# Altium footprint library hand_ad_lib.PcbLib: 105 footprints (part 2 of 7)
Each footprint in its own frame and in the unit in brackets; x right, y up, seen from the top. Pads: shape width x height; smd on the part's side, far side on the other; paste and mask are expansions set on the pad; w line width, h text height; cw(c..) or ccw(c..) is an arc to the next point about the centre after c.
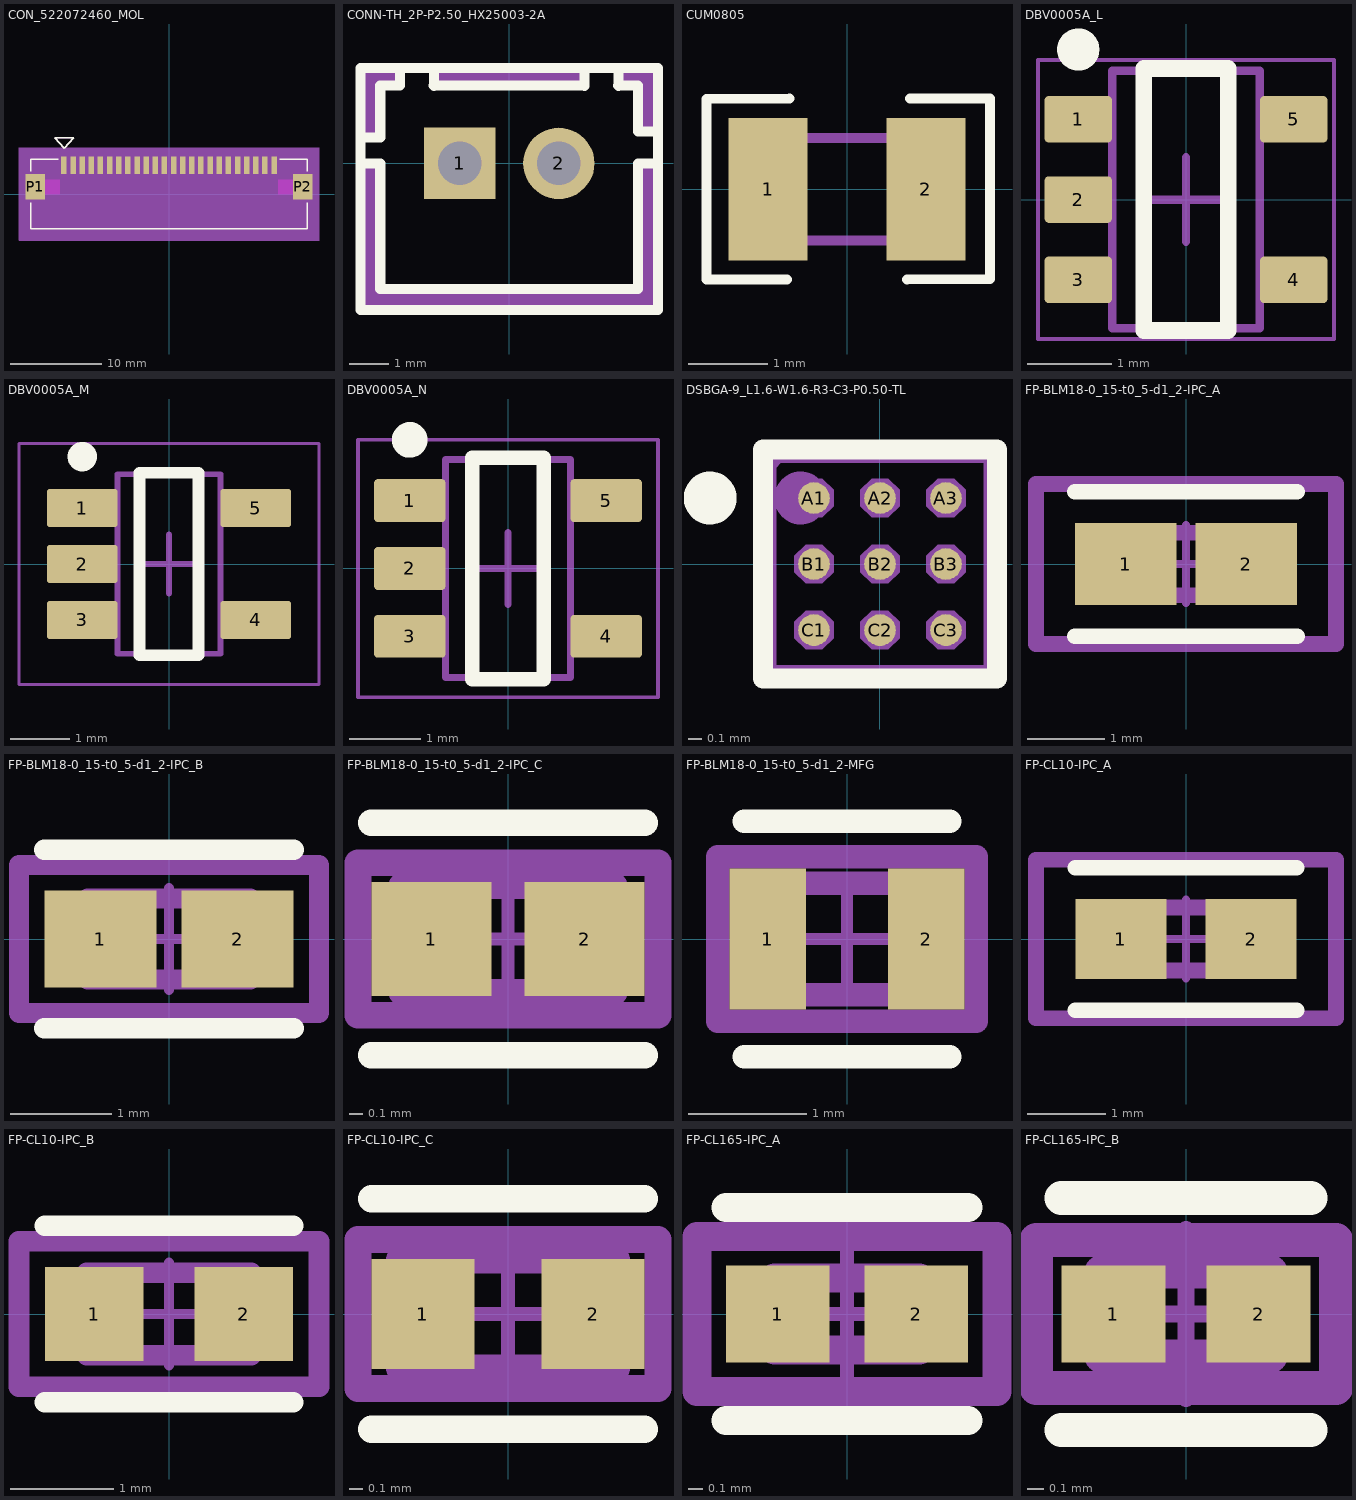
[diagram p1: the footprints below, top view; thin cyan lines are the x and y axes]

## CON_522072460_MOL [mm]
pads (26):
  rect 0.6x1.9 smd paste+0 mask+0.076: 1(-11.5,3.15) 2(-10.5,3.15) 3(-9.5,3.15) 4(-8.5,3.15) 5(-7.5,3.15) 6(-6.5,3.15) 7(-5.5,3.15) 8(-4.5,3.15) 9(-3.5,3.15) 10(-2.5,3.15) 11(-1.5,3.15) 12(-0.5,3.15) 13(0.5,3.15) 14(1.5,3.15) 15(2.5,3.15) 16(3.5,3.15) 17(4.5,3.15) 18(5.5,3.15) 19(6.5,3.15) 20(7.5,3.15) 21(8.5,3.15) 22(9.5,3.15) 23(10.5,3.15) 24(11.5,3.15)
  rect 2.1x2.8 smd paste+0 mask+0.076: P1(-14.65,0.8) P2(14.65,0.8)
Top Overlay:
  lines w0.152: -15.15,-0.918 -15.15,-3.8 15.15,-3.8 15.15,-0.918 ; -15.15,2.517 -15.15,3.8 -12.117,3.8 ; 12.118,3.8 15.15,3.8 15.15,2.517 ; -12.483,6.198 -11.467,5.004 -10.451,6.198 -12.483,6.198
Keep-Out Layer:
  region: 11.95,0 11.95,1.6 13.6,1.6 13.6,0
  region: -11.95,0 -11.95,1.6 -13.6,1.6 -13.6,0
Mechanical 13:
  lines w0.127: -15.15,-3.8 -15.15,3.8 15.15,3.8 15.15,-3.8 -15.15,-3.8 ; -12.483,6.198 -11.467,5.004 -10.451,6.198 -12.483,6.198
Mechanical 15:
  region: 16.42,5.07 -16.42,5.07 -16.42,-5.07 16.42,-5.07
  lines w0.127: -16.42,-5.07 16.42,-5.07 16.42,5.07 -16.42,5.07 -16.42,-5.07
3D body "522072460.stp": height 2.7, standoff 0, extent -15.15,-3.713 15.15,3.887

## CONN-TH_2P-P2.50_HX25003-2A [mm]
pads (2):
  rect 1.8x1.8 hole 1.1 paste+0 mask+0.05: 1(-1.25,0)
  round 1.8 hole 1.1 paste+0 mask+0.05: 2(1.25,0)
Top Overlay:
  lines w0.254: -3.75,-2.416 -3.75,0 -3.25,0 -3.25,-2.416 -3.25,-3.167 3.25,-3.167 3.25,-2.344 3.25,0 3.75,0 3.75,-2.344 ; -3.75,-1.603 -3.75,0.648 -3.25,0.65 -3.25,1.958 -2.75,1.958 -2.75,2.408 ; -1.9,1.95 -1.9,2.4 ; -1.9,1.958 1.9,1.958 ; 1.9,1.95 1.9,2.4 ; 2.75,1.95 2.75,2.399 ; 2.75,1.958 3.25,1.958 3.25,0.8 3.75,0.8 3.75,-1.501 ; -3.75,-3.7 -3.75,2.4 3.75,2.4 3.75,-3.7 -3.75,-3.7
Mechanical 6:
  region: 1.9,2.4 1.9,1.9 -1.9,1.9 -1.9,2.4
  region: 3.25,0 3.75,0 3.75,-3.7 -3.75,-3.7 -3.75,-0.05 -3.25,0 -3.25,-3.167 3.25,-3.167
  region: -2.75,1.9 -3.241,1.9 -3.25,1.908 -3.25,0.75 -3.75,0.75 -3.75,2.35 -2.751,2.35 -2.75,2.349
  region: 2.75,1.95 3.242,1.95 3.25,1.958 3.25,0.8 3.75,0.8 3.75,2.4 2.751,2.4 2.75,2.399
Mechanical 15:
  region: -3.69,-3.5 -3.69,-3.475 -3.725,-3.44 -3.775,-3.44 -3.81,-3.475 -3.81,-3.5 -3.81,-3.525 -3.775,-3.56 -3.725,-3.56 -3.69,-3.525
  region: -1.57,0.32 -0.93,0.32 -0.93,-0.32 -1.57,-0.32
  region: 0.93,0.32 1.57,0.32 1.57,-0.32 0.93,-0.32
  lines w0.051: -3.75,-3.5 3.75,-3.5 3.75,2.4 -3.75,2.4 -3.75,-3.5
3D body "ZX-XH2.54-2PZZ.x_t": height 7.3, standoff -3.3, extent -3.75,-3.5 3.75,2.4

## CUM0805 [mm]
pads (2):
  rect 1x1.8 smd: 1(-1,0) 2(1,0)
Top Overlay:
  lines w0.127: -0.762,-1.143 -1.778,-1.143 -1.778,0.195 -1.778,1.143 -0.728,1.151 ; 0.762,-1.143 1.812,-1.135 1.812,-0.188 1.812,1.151 0.796,1.151
Mechanical 1:
  lines w0.127: -1.025,-0.65 1.025,-0.65 1.025,0.65 -1.025,0.65 -1.025,-0.65
3D body "CUM0805-15FR010.x_t": height 0.41, standoff -0.01, extent -1.125,-0.68 1.125,0.68

## DBV0005A_L [mm] "SOT23, 5-Leads, Body 3.05x1.75mm, Pitch 0.95mm, IPC High Density"
height 1.45
pads (5):
  rrect18% 0.8x0.55 smd: 1(-1.275,0.95) 2(-1.275,0) 3(-1.275,-0.95) 4(1.275,-0.95) 5(1.275,0.95)
Top Overlay:
  circle w0.25: c-1.275,1.775 r0.125
  lines w0.2: -0.5,-1.55 0.5,-1.55 0.5,1.55 -0.5,1.55 -0.5,-1.55
Mechanical 1:
  text ".Designator" at -0.635,-0.254 h0.4
Mechanical 13:
  lines w0.1: -0.875,-1.525 -0.875,1.525 0.875,1.525 0.875,-1.525 -0.875,-1.525
Mechanical 15:
  lines w0.05: -1.75,-1.65 -1.75,1.65 1.75,1.65 1.75,-1.65 -1.75,-1.65
  lines w0.1: -0.5,0 0.5,0 ; 0,-0.5 0,0.5
3D body "DBV0005AaksMF05A.stp": height 1.08, standoff -0.01, extent -1.422,-1.461 1.422,1.46

## DBV0005A_M [mm] "SOT23, 5-Leads, Body 3.05x1.75mm, Pitch 0.95mm, IPC Low Density"
height 1.45
pads (5):
  rrect15% 1.2x0.65 smd: 1(-1.475,0.95) 2(-1.475,0) 3(-1.475,-0.95) 4(1.475,-0.95) 5(1.475,0.95)
Top Overlay:
  circle w0.25: c-1.475,1.825 r0.125
  lines w0.2: -0.5,-1.55 0.5,-1.55 0.5,1.55 -0.5,1.55 -0.5,-1.55
Mechanical 1:
  text ".Designator" at -0.635,-0.127 h0.4
Mechanical 13:
  lines w0.1: -0.875,-1.525 -0.875,1.525 0.875,1.525 0.875,-1.525 -0.875,-1.525
Mechanical 15:
  lines w0.05: -2.55,-2.05 -2.55,2.05 2.55,2.05 2.55,-2.05 -2.55,-2.05
  lines w0.1: -0.5,0 0.5,0 ; 0,-0.5 0,0.5
3D body "DBV0005AaksMF05A.stp": height 1.08, standoff -0.01, extent -1.422,-1.461 1.422,1.46

## DBV0005A_N [mm] "SOT23, 5-Leads, Body 3.05x1.75mm, Pitch 0.95mm, IPC Medium Density"
height 1.45
pads (5):
  rrect17% 1x0.6 smd: 1(-1.375,0.95) 2(-1.375,0) 3(-1.375,-0.95) 4(1.375,-0.95) 5(1.375,0.95)
Top Overlay:
  circle w0.25: c-1.375,1.8 r0.125
  lines w0.2: -0.5,-1.55 -0.5,1.55 0.5,1.55 0.5,-1.55 -0.5,-1.55
Mechanical 1:
  text ".Designator" at -0.635,-0.254 h0.4
Mechanical 13:
  lines w0.1: -0.875,-1.525 0.875,-1.525 0.875,1.525 -0.875,1.525 -0.875,-1.525
Mechanical 15:
  lines w0.05: -2.1,-1.8 2.1,-1.8 2.1,1.8 -2.1,1.8 -2.1,-1.8
  lines w0.1: -0.5,0 0.5,0 ; 0,-0.5 0,0.5
3D body "DBV0005AaksMF05A.stp": height 1.08, standoff -0.01, extent -1.422,-1.461 1.422,1.46

## DSBGA-9_L1.6-W1.6-R3-C3-P0.50-TL [mm]
pads (9):
  round 0.24 smd paste-100 mask+0.038: A1(-0.5,0.5) A2(0,0.5) A3(0.5,0.5) B1(-0.5,0) B2(0,0) B3(0.5,0) C1(-0.5,-0.5) C2(0,-0.5) C3(0.5,-0.5)
Top Overlay:
  circle w0.2: c-1.286,0.5 r0.1
  lines w0.152: -0.886,-0.866 0.886,-0.866 0.886,0.866 -0.886,0.866 -0.886,-0.866
Top Paste:
  region: -0.605,0.65 -0.395,0.65 -0.35,0.605 -0.35,0.395 -0.395,0.35 -0.605,0.35 -0.65,0.395 -0.65,0.605
  region: -0.605,0.15 -0.395,0.15 -0.35,0.105 -0.35,-0.105 -0.395,-0.15 -0.605,-0.15 -0.65,-0.105 -0.65,0.105
  region: -0.605,-0.35 -0.395,-0.35 -0.35,-0.395 -0.35,-0.605 -0.395,-0.65 -0.605,-0.65 -0.65,-0.605 -0.65,-0.395
  region: -0.105,0.65 0.105,0.65 0.15,0.605 0.15,0.395 0.105,0.35 -0.105,0.35 -0.15,0.395 -0.15,0.605
  region: -0.105,0.15 0.105,0.15 0.15,0.105 0.15,-0.105 0.105,-0.15 -0.105,-0.15 -0.15,-0.105 -0.15,0.105
  region: -0.105,-0.35 0.105,-0.35 0.15,-0.395 0.15,-0.605 0.105,-0.65 -0.105,-0.65 -0.15,-0.605 -0.15,-0.395
  region: 0.395,0.65 0.605,0.65 0.65,0.605 0.65,0.395 0.605,0.35 0.395,0.35 0.35,0.395 0.35,0.605
  region: 0.395,0.15 0.605,0.15 0.65,0.105 0.65,-0.105 0.605,-0.15 0.395,-0.15 0.35,-0.105 0.35,0.105
  region: 0.395,-0.35 0.605,-0.35 0.65,-0.395 0.65,-0.605 0.605,-0.65 0.395,-0.65 0.35,-0.605 0.35,-0.395
Mechanical 6:
  circle w0.2: c-0.6,0.5 r0.1
Mechanical 15:
  region: -0.75,0.79 -0.75,0.815 -0.785,0.849 -0.834,0.849 -0.869,0.814 -0.87,0.79 -0.869,0.765 -0.834,0.731 -0.785,0.731 -0.75,0.766
  region: -0.35,0.5 -0.351,0.561 -0.439,0.647 -0.561,0.646 -0.649,0.561 -0.65,0.5 -0.648,0.439 -0.561,0.353 -0.439,0.353 -0.351,0.439
  region: -0.35,0 -0.351,0.061 -0.439,0.147 -0.561,0.147 -0.649,0.061 -0.65,0 -0.648,-0.061 -0.561,-0.146 -0.439,-0.146 -0.351,-0.061
  region: -0.35,-0.5 -0.351,-0.439 -0.439,-0.353 -0.561,-0.354 -0.649,-0.439 -0.65,-0.5 -0.648,-0.561 -0.561,-0.647 -0.439,-0.647 -0.351,-0.561
  region: 0.15,0.5 0.149,0.561 0.061,0.647 -0.061,0.646 -0.148,0.561 -0.15,0.5 -0.148,0.439 -0.061,0.353 0.061,0.353 0.149,0.439
  region: 0.15,0 0.149,0.061 0.061,0.147 -0.061,0.147 -0.148,0.061 -0.15,0 -0.148,-0.061 -0.061,-0.146 0.061,-0.146 0.149,-0.061
  region: 0.15,-0.5 0.149,-0.439 0.061,-0.353 -0.061,-0.354 -0.148,-0.439 -0.15,-0.5 -0.148,-0.561 -0.061,-0.647 0.061,-0.647 0.149,-0.561
  region: 0.65,0.5 0.649,0.561 0.561,0.647 0.439,0.646 0.351,0.561 0.35,0.5 0.352,0.439 0.439,0.353 0.561,0.353 0.649,0.439
  region: 0.65,0 0.649,0.061 0.561,0.147 0.439,0.147 0.351,0.061 0.35,0 0.352,-0.061 0.439,-0.146 0.561,-0.146 0.649,-0.061
  region: 0.65,-0.5 0.649,-0.439 0.561,-0.353 0.439,-0.354 0.351,-0.439 0.35,-0.5 0.352,-0.561 0.439,-0.647 0.561,-0.647 0.649,-0.561
  lines w0.051: -0.81,-0.79 0.81,-0.79 0.81,0.79 -0.81,0.79 -0.81,-0.79
3D body "BQ27427YZER_Mod.x_t": height 0.64, standoff 0, extent -0.79,-0.81 0.79,0.81

## FP-BLM18-0_15-t0_5-d1_2-IPC_A [mm]
pads (2):
  rect 1.306x1.058 smd paste+0 mask+0: 1(-0.776,0) 2(0.776,0)
Top Overlay:
  lines w0.2: -1.429,-0.929 1.429,-0.929 ; -1.429,0.929 1.429,0.929
Top 3D Body:
  lines w0.2: -0.8,-0.4 -0.8,0.4 0.8,0.4 0.8,-0.4 -0.8,-0.4
Top Courtyard:
  lines w0.2: -1.929,-1.029 -1.929,1.029 1.929,1.029 1.929,-1.029 -1.929,-1.029
Top Assembly:
  lines w0.2: -1.929,-1.029 -1.929,1.029 1.929,1.029 1.929,-1.029 -1.929,-1.029
  text ".Designator" at 0,0.188 h1
Top Component Center:
  lines w0.1: -0.5,0 0.5,0 ; 0,-0.5 0,0.5
3D body "FBead_Murata_BLM18SG121TZ1D_eec.STEP": height 0.25, standoff 0, extent -1.929,-1.029 1.929,1.029

## FP-BLM18-0_15-t0_5-d1_2-IPC_B [mm]
pads (2):
  rect 1.106x0.958 smd paste+0 mask+0: 1(-0.676,0) 2(0.676,0)
Top Overlay:
  lines w0.2: -1.229,-0.879 1.229,-0.879 ; -1.229,0.879 1.229,0.879
Top 3D Body:
  lines w0.2: -0.8,-0.4 0.8,-0.4 0.8,0.4 -0.8,0.4 -0.8,-0.4
Top Courtyard:
  lines w0.2: -1.479,-0.729 1.479,-0.729 1.479,0.729 -1.479,0.729 -1.479,-0.729
Top Assembly:
  lines w0.2: -1.479,-0.729 1.479,-0.729 1.479,0.729 -1.479,0.729 -1.479,-0.729
  text ".Designator" at 0,0.188 h1
Top Component Center:
  lines w0.1: -0.5,0 0.5,0 ; 0,-0.5 0,0.5
3D body "FBead_Murata_BLM18SG121TZ1D_eec.STEP": height 0.25, standoff 0, extent -1.479,-0.729 1.479,0.729

## FP-BLM18-0_15-t0_5-d1_2-IPC_C [mm]
pads (2):
  rect 0.906x0.858 smd paste+0 mask+0: 1(-0.576,0) 2(0.576,0)
Top Overlay:
  lines w0.2: -1.029,-0.875 1.029,-0.875 ; -1.029,0.875 1.029,0.875
Top 3D Body:
  lines w0.2: -0.8,-0.4 -0.8,0.4 0.8,0.4 0.8,-0.4 -0.8,-0.4
Top Courtyard:
  lines w0.2: -1.129,-0.575 -1.129,0.575 1.129,0.575 1.129,-0.575 -1.129,-0.575
Top Assembly:
  lines w0.2: -1.129,-0.575 -1.129,0.575 1.129,0.575 1.129,-0.575 -1.129,-0.575
  text ".Designator" at 0,0.188 h1
Top Component Center:
  lines w0.1: -0.5,0 0.5,0 ; 0,-0.5 0,0.5
3D body "FBead_Murata_BLM18SG121TZ1D_eec.STEP": height 0.25, standoff 0, extent -1.129,-0.575 1.129,0.575

## FP-BLM18-0_15-t0_5-d1_2-MFG [mm]
pads (2):
  rect 0.65x1.2 smd paste-1000 mask-1000: 1(-0.675,0) 2(0.675,0)
Top Overlay:
  lines w0.2: -0.875,-1 0.875,-1 ; -0.875,1 0.875,1
Top Paste:
  rectangle: 0.35,-0.35 1,0.35
  rectangle: -1,-0.35 -0.35,0.35
Top Solder:
  rectangle: 0.35,-0.35 1,0.35
  rectangle: -1,-0.35 -0.35,0.35
Top 3D Body:
  lines w0.2: -0.875,-0.475 -0.875,0.475 0.875,0.475 0.875,-0.475 -0.875,-0.475
Top Courtyard:
  lines w0.2: -1.1,-0.7 -1.1,0.7 1.1,0.7 1.1,-0.7 -1.1,-0.7
Top Assembly:
  lines w0.2: -1.1,-0.7 -1.1,0.7 1.1,0.7 1.1,-0.7 -1.1,-0.7
  text ".Designator" at 0,-0.001 h1
Top Component Center:
  lines w0.1: -0.5,0 0.5,0 ; 0,-0.5 0,0.5
3D body "FBead_Murata_BLM18SG121TZ1D_eec.STEP": height 0.25, standoff 0, extent -1.1,-0.7 1.1,0.7

## FP-CL10-IPC_A [mm]
pads (2):
  rect 1.158x1.012 smd paste+0 mask+0: 1(-0.827,0) 2(0.827,0)
Top Overlay:
  lines w0.2: -1.406,-0.906 1.406,-0.906 ; -1.406,0.906 1.406,0.906
Top 3D Body:
  lines w0.2: -0.8,-0.4 0.8,-0.4 0.8,0.4 -0.8,0.4 -0.8,-0.4
Top Courtyard:
  lines w0.2: -1.906,-1.006 1.906,-1.006 1.906,1.006 -1.906,1.006 -1.906,-1.006
Top Assembly:
  lines w0.2: -1.906,-1.006 1.906,-1.006 1.906,1.006 -1.906,1.006 -1.906,-1.006
  text ".Designator" at 0,0.188 h1
Top Component Center:
  lines w0.1: -0.5,0 0.5,0 ; 0,-0.5 0,0.5
3D body "Cap_Samsung_CL10B473KO8NNWC_eec.STEP": height 0.25, standoff 0, extent -1.906,-1.006 1.906,1.006

## FP-CL10-IPC_B [mm]
pads (2):
  rect 0.958x0.912 smd paste+0 mask+0: 1(-0.727,0) 2(0.727,0)
Top Overlay:
  lines w0.2: -1.206,-0.856 1.206,-0.856 ; -1.206,0.856 1.206,0.856
Top 3D Body:
  lines w0.2: -0.8,-0.4 0.8,-0.4 0.8,0.4 -0.8,0.4 -0.8,-0.4
Top Courtyard:
  lines w0.2: -1.456,-0.706 1.456,-0.706 1.456,0.706 -1.456,0.706 -1.456,-0.706
Top Assembly:
  lines w0.2: -1.456,-0.706 1.456,-0.706 1.456,0.706 -1.456,0.706 -1.456,-0.706
  text ".Designator" at 0,0.188 h1
Top Component Center:
  lines w0.1: -0.5,0 0.5,0 ; 0,-0.5 0,0.5
3D body "Cap_Samsung_CL10B473KO8NNWC_eec.STEP": height 0.25, standoff 0, extent -1.456,-0.706 1.456,0.706

## FP-CL10-IPC_C [mm]
pads (2):
  rect 0.758x0.812 smd paste+0 mask+0: 1(-0.627,0) 2(0.627,0)
Top Overlay:
  lines w0.2: -1.006,-0.85 1.006,-0.85 ; -1.006,0.85 1.006,0.85
Top 3D Body:
  lines w0.2: -0.8,-0.4 0.8,-0.4 0.8,0.4 -0.8,0.4 -0.8,-0.4
Top Courtyard:
  lines w0.2: -1.106,-0.55 1.106,-0.55 1.106,0.55 -1.106,0.55 -1.106,-0.55
Top Assembly:
  lines w0.2: -1.106,-0.55 1.106,-0.55 1.106,0.55 -1.106,0.55 -1.106,-0.55
  text ".Designator" at 0,0.188 h1
Top Component Center:
  lines w0.1: -0.5,0 0.5,0 ; 0,-0.5 0,0.5
3D body "Cap_Samsung_CL10B473KO8NNWC_eec.STEP": height 0.25, standoff 0, extent -1.106,-0.55 1.106,0.55

## FP-CL165-IPC_A [mm]
pads (2):
  rect 0.715x0.672 smd paste+0 mask+0: 1(-0.479,0) 2(0.479,0)
Top Overlay:
  lines w0.2: -0.836,-0.736 0.836,-0.736 ; -0.836,0.736 0.836,0.736
Top 3D Body:
  lines w0.2: -0.5,-0.25 0.5,-0.25 0.5,0.25 -0.5,0.25 -0.5,-0.25
Top Courtyard:
  lines w0.2: -1.036,-0.536 1.036,-0.536 1.036,0.536 -1.036,0.536 -1.036,-0.536
Top Assembly:
  lines w0.2: -1.036,-0.536 1.036,-0.536 1.036,0.536 -1.036,0.536 -1.036,-0.536
  text ".Designator" at 0,0.188 h1
Top Component Center:
  lines w0.1: -0.5,0 0.5,0 ; 0,-0.5 0,0.5
3D body "Cap_Samsung_CL05B103KB5NNNC_eec.STEP": height 0.25, standoff 0, extent -1.036,-0.536 1.036,0.536

## FP-CL165-IPC_B [mm]
pads (2):
  rect 0.615x0.572 smd paste+0 mask+0: 1(-0.429,0) 2(0.429,0)
Top Overlay:
  lines w0.2: -0.736,-0.686 0.736,-0.686 ; -0.736,0.686 0.736,0.686
Top 3D Body:
  lines w0.2: -0.5,-0.25 0.5,-0.25 0.5,0.25 -0.5,0.25 -0.5,-0.25
Top Courtyard:
  lines w0.2: -0.886,-0.436 0.886,-0.436 0.886,0.436 -0.886,0.436 -0.886,-0.436
Top Assembly:
  lines w0.2: -0.886,-0.436 0.886,-0.436 0.886,0.436 -0.886,0.436 -0.886,-0.436
  text ".Designator" at 0,-0.001 h1
Top Component Center:
  lines w0.1: -0.5,0 0.5,0 -0.5,0 ; 0,-0.5 0,0.5 0,-0.5
3D body "Cap_Samsung_CL05B103KB5NNNC_eec.STEP": height 0.25, standoff 0, extent -0.886,-0.436 0.886,0.436